# Altium footprint library AD_Connectors.PcbLib: 130 footprints (part 9 of 9)
Each footprint in its own frame and in the unit in brackets; x right, y up, seen from the top. Pads: shape width x height; smd on the part's side, far side on the other; paste and mask are expansions set on the pad; w line width, h text height; cw(c..) or ccw(c..) is an arc to the next point about the centre after c.
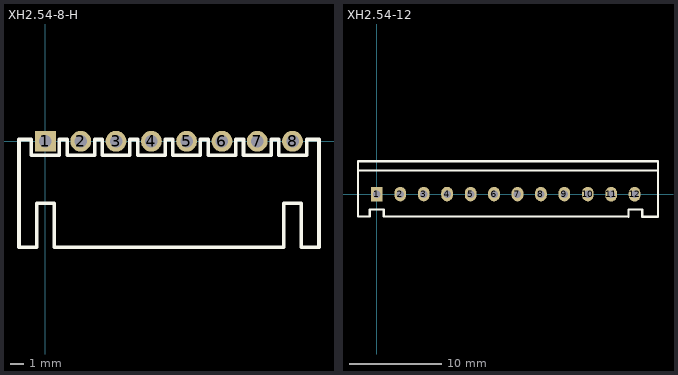
[diagram p8: the footprints below, top view; thin cyan lines are the x and y axes]

## XH2.54-8-H [mm]
pads (8):
  rect 1.5x1.5 hole 0.9: 1(0,0)
  round 1.5 hole 0.9: 2(2.54,0) 3(5.08,0) 4(7.62,0) 5(10.16,0) 6(12.7,0) 7(15.24,0) 8(17.78,0)
Top Overlay:
  lines w0.254: 1.538,0.127 0.992,0.127 0.992,-1.016 -1.016,-1.016 -1.016,0.127 -1.905,0.127 -1.905,-7.62 -0.635,-7.62 -0.635,-4.445 0.635,-4.445 0.635,-7.62 17.145,-7.62 17.145,-4.445 18.415,-4.445 18.415,-7.62 19.685,-7.62 19.685,0.127 18.796,0.127 18.796,-1.016 16.792,-1.016 16.792,0.127 ; 1.552,0.127 1.552,-1.016 3.532,-1.016 3.532,0.127 4.078,0.127 ; 4.092,0.127 4.092,-1.016 6.072,-1.016 6.072,0.127 6.618,0.127 ; 6.632,0.127 6.632,-1.016 8.612,-1.016 8.612,0.127 9.158,0.127 ; 9.172,0.127 9.172,-1.016 11.152,-1.016 11.152,0.127 11.698,0.127 ; 11.712,0.127 11.712,-1.016 13.692,-1.016 13.692,0.127 14.238,0.127 ; 14.252,0.127 14.252,-1.016 16.232,-1.016 16.232,0.127 16.778,0.127
3D body "HDR2.54xV8.STEP": height 6, standoff -2, extent -1.905,-7.62 19.685,0.273

## XH2.54-12 [mil]
pads (12):
  rect 50x62 hole 32: 1(0,0)
  oval 50x62 hole 32: 2(100.5,0.5) 3(200.5,0.5) 4(300,0.73) 5(400.5,0.5) 6(500.5,0.5) 7(600.5,0.5) 8(700.5,0.5) 9(800.5,0.5) 10(900.5,0.5) 11(1000,0) 12(1100,0)
Top Overlay:
  lines w10: -80,101 1200,101 ; 1074.41,-95.5 1074.41,-65 1133.46,-65 1133.46,-95.5 1199.5,-95.5 ; 1074.41,-95 29.53,-95 29.53,-65 -29.53,-65 -29.53,-95 -80,-95 -80,140 1200,140 1200,-95
3D body "HDR2.54x12.STEP": height 240, standoff -78.74, extent -80,-93 1200,143